# Altium schematic symbol library Diodes - TVS.SchLib: 5379 symbols (part 35 of 35)
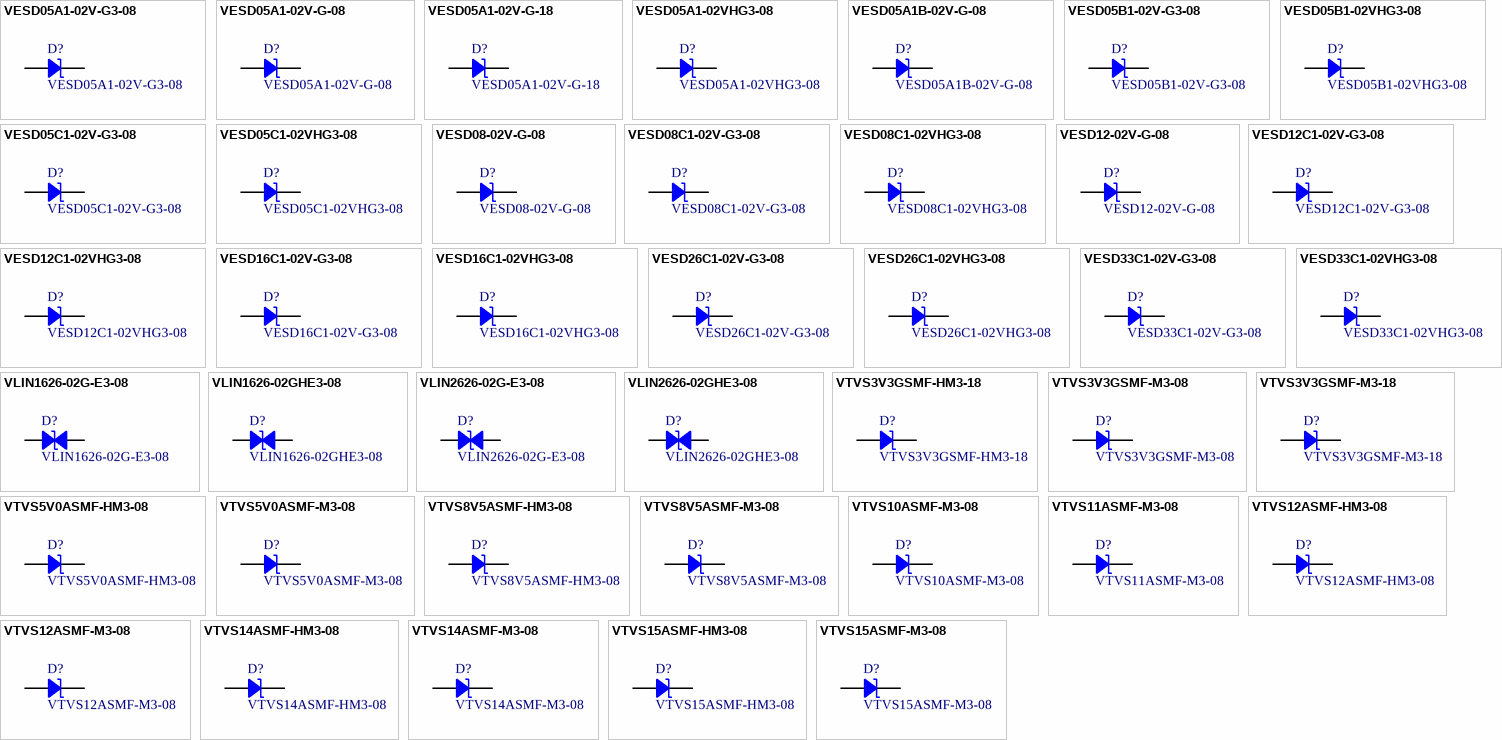
[diagram p168: symbols VESD05A1-02V-G3-08 to VTVS15ASMF-M3-08]

## VTVS3V3GSMF-HM3-18
designator D?
ESD PROTECTION DIODE DO-219AB-HM; Manufacturer: Vishay Semiconductor Diodes Division; Capacitance @ Frequency: 2095pF @ 1MHz; Current - Peak Pulse (10/1000µs): 43.99A; Power Line Protection: No; Power - Peak Pulse: 400W; Type: Zener; Unidirectional Channels: 1; Voltage - Breakdown (Min): 6.57V; Voltage - Clamping (Max) @ Ipp: 8.9V; Voltage - Reverse Standoff (Typ): 3.3V; Part Number: VTVS3V3GSMF-HM3-18; Applications: Automotive; ComponentLink1Description: Datasheet; ComponentLink1URL: http://www.vishay.com/docs/85891/vtvs3v3asmf.pdf; ComponentLink2Description: DigiKey Link; ComponentLink2URL: http://digikey.com/product-detail/en/vishay-semiconductor-diodes-division/VTVS3V3GSMF-HM3-18/VTVS3V3GSMF-HM3-18GICT-ND/9467502; LastUpdated: 9/2/2020 1:27:45 AM; Lifecycle Status: Active; Minimum Order: 1; Mounting Type: Surface Mount; Operating Temperature: 175°C (TJ); Package / Case: DO-219AB; Packaging: TapeAndReel; PartId: 5498; Part Status: Active; Price: 0.19; Series: Automotive, AEC-Q101, TransZorb®; Supplier 1: DigiKey; Supplier Part Number 1: VTVS3V3GSMF-HM3-18GICT-ND; Supplier Device Package: DO-219AB (SMF)
footprint SMF DO-219AB
pins: 1, 2

## VTVS3V3GSMF-M3-08
designator D?
ESD PROTECTION DIODE DO-219AB-M3; Manufacturer: Vishay Semiconductor Diodes Division; Capacitance @ Frequency: 2095pF @ 1MHz; Current - Peak Pulse (10/1000µs): 43.99A; Power Line Protection: No; Power - Peak Pulse: 400W; Type: Zener; Unidirectional Channels: 1; Voltage - Breakdown (Min): 6.57V; Voltage - Clamping (Max) @ Ipp: 8.9V; Voltage - Reverse Standoff (Typ): 3.3V; Part Number: VTVS3V3GSMF-M3-08; Applications: General Purpose; ComponentLink1Description: Datasheet; ComponentLink1URL: http://www.vishay.com/docs/85891/vtvs3v3asmf.pdf; ComponentLink2Description: DigiKey Link; ComponentLink2URL: http://digikey.com/product-detail/en/vishay-semiconductor-diodes-division/VTVS3V3GSMF-M3-08/VTVS3V3GSMF-M3-08GICT-ND/9467503; LastUpdated: 9/2/2020 1:27:45 AM; Lifecycle Status: Active; Minimum Order: 1; Mounting Type: Surface Mount; Operating Temperature: 175°C (TJ); Package / Case: DO-219AB; Packaging: TapeAndReel; PartId: 5497; Part Status: Active; Price: 0.21; Series: TransZorb®; Supplier 1: DigiKey; Supplier Part Number 1: VTVS3V3GSMF-M3-08GICT-ND; Supplier Device Package: DO-219AB (SMF)
footprint SMF DO-219AB
pins: 1, 2

## VTVS3V3GSMF-M3-18
designator D?
ESD PROTECTION DIODE DO-219AB-M3; Manufacturer: Vishay Semiconductor Diodes Division; Capacitance @ Frequency: 2095pF @ 1MHz; Current - Peak Pulse (10/1000µs): 43.99A; Power Line Protection: No; Power - Peak Pulse: 400W; Type: Zener; Unidirectional Channels: 1; Voltage - Breakdown (Min): 6.57V; Voltage - Clamping (Max) @ Ipp: 8.9V; Voltage - Reverse Standoff (Typ): 3.3V; Part Number: VTVS3V3GSMF-M3-18; Applications: General Purpose; ComponentLink1Description: Datasheet; ComponentLink1URL: http://www.vishay.com/docs/85891/vtvs3v3asmf.pdf; ComponentLink2Description: DigiKey Link; ComponentLink2URL: http://digikey.com/product-detail/en/vishay-semiconductor-diodes-division/VTVS3V3GSMF-M3-18/VTVS3V3GSMF-M3-18GICT-ND/9467504; LastUpdated: 9/2/2020 1:27:45 AM; Lifecycle Status: Active; Minimum Order: 1; Mounting Type: Surface Mount; Operating Temperature: 175°C (TJ); Package / Case: DO-219AB; Packaging: TapeAndReel; PartId: 5499; Part Status: Active; Price: 0.17; Series: TransZorb®; Supplier 1: DigiKey; Supplier Part Number 1: VTVS3V3GSMF-M3-18GICT-ND; Supplier Device Package: DO-219AB (SMF)
footprint SMF DO-219AB
pins: 1, 2

## VTVS5V0ASMF-HM3-08
designator D?
TVS DIODE 5V 8.9V DO219AB; Manufacturer: Vishay Semiconductor Diodes Division; Capacitance @ Frequency: 2095pF @ 1MHz; Current - Peak Pulse (10/1000µs): 42.95A; Power Line Protection: No; Power - Peak Pulse: 400W; Type: Zener; Unidirectional Channels: 1; Voltage - Breakdown (Min): 6.4V; Part Number: VTVS5V0ASMF-HM3-08; Applications: Automotive; ComponentLink1Description: Datasheet; ComponentLink1URL: http://www.vishay.com/docs/85891/vtvs3v3asmf.pdf; ComponentLink2Description: DigiKey Link; ComponentLink2URL: http://digikey.com/product-detail/en/vishay-semiconductor-diodes-division/VTVS5V0ASMF-HM3-08/VTVS5V0ASMF-HM3-08GICT-ND/7056002; LastUpdated: 9/2/2020 1:27:46 AM; Lifecycle Status: Active; Minimum Order: 1; Mounting Type: Surface Mount; Operating Temperature: -55°C ~ 175°C (TJ); Package / Case: DO-219AB; Packaging: TapeAndReel; PartId: 5532; Part Status: Active; Price: 0.12; Series: Automotive, AEC-Q101, TransZorb®; Supplier 1: DigiKey; Supplier Part Number 1: VTVS5V0ASMF-HM3-08GICT-ND; Supplier Device Package: DO-219AB (SMF); Voltage - Clamping (Max) @ Ipp: 8.9V; Voltage - Reverse Standoff (Typ): 5V
footprint SMF DO-219AB
pins: 1, 2

## VTVS5V0ASMF-M3-08
designator D?
TVS DIODE 5V 8.9V DO219AB; Manufacturer: Vishay Semiconductor Diodes Division; Capacitance @ Frequency: 2095pF @ 1MHz; Current - Peak Pulse (10/1000µs): 42.95A; Power Line Protection: No; Power - Peak Pulse: 400W; Type: Zener; Unidirectional Channels: 1; Voltage - Breakdown (Min): 6.4V; Part Number: VTVS5V0ASMF-M3-08; Applications: General Purpose; ComponentLink1Description: Datasheet; ComponentLink1URL: http://www.vishay.com/docs/85891/vtvs3v3asmf.pdf; ComponentLink2Description: DigiKey Link; ComponentLink2URL: http://digikey.com/product-detail/en/vishay-semiconductor-diodes-division/VTVS5V0ASMF-M3-08/VTVS5V0ASMF-M3-08GICT-ND/7056003; LastUpdated: 9/2/2020 1:27:45 AM; Lifecycle Status: Active; Minimum Order: 1; Mounting Type: Surface Mount; Operating Temperature: -55°C ~ 175°C (TJ); Package / Case: DO-219AB; Packaging: TapeAndReel; PartId: 5492; Part Status: Active; Price: 0.11; Series: TransZorb®; Supplier 1: DigiKey; Supplier Part Number 1: VTVS5V0ASMF-M3-08GICT-ND; Supplier Device Package: DO-219AB (SMF); Voltage - Clamping (Max) @ Ipp: 8.9V; Voltage - Reverse Standoff (Typ): 5V
footprint SMF DO-219AB
pins: 1, 2

## VTVS8V5ASMF-HM3-08
designator D?
TVS DIODE 8.5V 13.5V DO219AB; Manufacturer: Vishay Semiconductor Diodes Division; Capacitance @ Frequency: 1270pF @ 1MHz; Current - Peak Pulse (10/1000µs): 28.24A; Power Line Protection: No; Power - Peak Pulse: 400W; Type: Zener; Unidirectional Channels: 1; Voltage - Breakdown (Min): 9.5V; Part Number: VTVS8V5ASMF-HM3-08; Applications: Automotive; ComponentLink1Description: Datasheet; ComponentLink1URL: http://www.vishay.com/docs/85891/vtvs3v3asmf.pdf; ComponentLink2Description: DigiKey Link; ComponentLink2URL: http://digikey.com/product-detail/en/vishay-semiconductor-diodes-division/VTVS8V5ASMF-HM3-08/VTVS8V5ASMF-HM3-08GICT-ND/7402749; LastUpdated: 9/2/2020 1:27:45 AM; Lifecycle Status: Active; Minimum Order: 1; Mounting Type: Surface Mount; Operating Temperature: -55°C ~ 175°C (TJ); Package / Case: DO-219AB; Packaging: TapeAndReel; PartId: 5527; Part Status: Active; Price: 0.12; Series: Automotive, AEC-Q101, TransZorb®; Supplier 1: DigiKey; Supplier Part Number 1: VTVS8V5ASMF-HM3-08GICT-ND; Supplier Device Package: DO-219AB (SMF); Voltage - Clamping (Max) @ Ipp: 13.5V; Voltage - Reverse Standoff (Typ): 8.5V
footprint SMF DO-219AB
pins: 1, 2

## VTVS8V5ASMF-M3-08
designator D?
TVS DIODE 8.5V 13.5V DO219AB; Manufacturer: Vishay Semiconductor Diodes Division; Capacitance @ Frequency: 1270pF @ 1MHz; Current - Peak Pulse (10/1000µs): 28.24A; Power Line Protection: No; Power - Peak Pulse: 400W; Type: Zener; Unidirectional Channels: 1; Voltage - Breakdown (Min): 9.5V; Part Number: VTVS8V5ASMF-M3-08; Applications: General Purpose; ComponentLink1Description: Datasheet; ComponentLink1URL: http://www.vishay.com/docs/85891/vtvs3v3asmf.pdf; ComponentLink2Description: DigiKey Link; ComponentLink2URL: http://digikey.com/product-detail/en/vishay-semiconductor-diodes-division/VTVS8V5ASMF-M3-08/VTVS8V5ASMF-M3-08GICT-ND/7402750; LastUpdated: 9/2/2020 1:27:45 AM; Lifecycle Status: Active; Minimum Order: 1; Mounting Type: Surface Mount; Operating Temperature: -55°C ~ 175°C (TJ); Package / Case: DO-219AB; Packaging: TapeAndReel; PartId: 5489; Part Status: Active; Price: 0.11; Series: TransZorb®; Supplier 1: DigiKey; Supplier Part Number 1: VTVS8V5ASMF-M3-08GICT-ND; Supplier Device Package: DO-219AB (SMF); Voltage - Clamping (Max) @ Ipp: 13.5V; Voltage - Reverse Standoff (Typ): 8.5V
footprint SMF DO-219AB
pins: 1, 2

## VTVS10ASMF-M3-08
designator D?
TVS DIODE 10.3V 16.3V DO219AB; Manufacturer: Vishay Semiconductor Diodes Division; Capacitance @ Frequency: 988pF @ 1MHz; Current - Peak Pulse (10/1000µs): 23.2A; Power Line Protection: No; Power - Peak Pulse: 400W; Type: Zener; Unidirectional Channels: 1; Voltage - Breakdown (Min): 11.4V; Part Number: VTVS10ASMF-M3-08; Applications: General Purpose; ComponentLink1Description: Datasheet; ComponentLink1URL: http://www.vishay.com/docs/85891/vtvs3v3asmf.pdf; ComponentLink2Description: DigiKey Link; ComponentLink2URL: http://digikey.com/product-detail/en/vishay-semiconductor-diodes-division/VTVS10ASMF-M3-08/VTVS10ASMF-M3-08GICT-ND/7055978; LastUpdated: 9/2/2020 1:27:45 AM; Lifecycle Status: Active; Minimum Order: 1; Mounting Type: Surface Mount; Operating Temperature: -55°C ~ 175°C (TJ); Package / Case: DO-219AB; Packaging: TapeAndReel; PartId: 5528; Part Status: Active; Price: 0.11; Series: TransZorb®; Supplier 1: DigiKey; Supplier Part Number 1: VTVS10ASMF-M3-08GICT-ND; Supplier Device Package: DO-219AB (SMF); Voltage - Clamping (Max) @ Ipp: 16.3V; Voltage - Reverse Standoff (Typ): 10.3V
footprint SMF DO-219AB
pins: 1, 2

## VTVS11ASMF-M3-08
designator D?
TVS DIODE 11.2V 18V DO219AB; Manufacturer: Vishay Semiconductor Diodes Division; Capacitance @ Frequency: 910pF @ 1MHz; Current - Peak Pulse (10/1000µs): 21.13A; Power Line Protection: No; Power - Peak Pulse: 400W; Type: DO-219AB; Unidirectional Channels: 1; Voltage - Breakdown (Min): 12.6V; Part Number: VTVS11ASMF-M3-08; Applications: General Purpose; ComponentLink1Description: Datasheet; ComponentLink1URL: http://www.vishay.com/docs/85891/vtvs3v3asmf.pdf; ComponentLink2Description: DigiKey Link; ComponentLink2URL: http://digikey.com/product-detail/en/vishay-semiconductor-diodes-division/VTVS11ASMF-M3-08/112-VTVS11ASMF-M3-08CT-ND/11562550; LastUpdated: 9/2/2020 1:27:45 AM; Lifecycle Status: Active; Minimum Order: 0; Mounting Type: Surface Mount; Operating Temperature: -55°C ~ 175°C (TJ); Package / Case: DO-219AB; Packaging: TapeAndReel; PartId: 5482; Part Status: -55°C ~ 175°C (TJ); Price: 0.09; Series: TransZorb®; Supplier 1: DigiKey; Supplier Part Number 1: 112-VTVS11ASMF-M3-08CT-ND; Supplier Device Package: DO-219AB (SMF); Voltage - Clamping (Max) @ Ipp: 18V; Voltage - Reverse Standoff (Typ): 11.2V
footprint SMF DO-219AB
pins: 1, 2

## VTVS12ASMF-HM3-08
designator D?
TVS DIODE 12.4V 20.1V DO219AB; Manufacturer: Vishay Semiconductor Diodes Division; Capacitance @ Frequency: 807pF @ 1MHz; Current - Peak Pulse (10/1000µs): 19.01A; Power Line Protection: No; Power - Peak Pulse: 400W; Type: Zener; Unidirectional Channels: 1; Voltage - Breakdown (Min): 14V; Part Number: VTVS12ASMF-HM3-08; Applications: Automotive; ComponentLink1Description: Datasheet; ComponentLink1URL: http://www.vishay.com/docs/85891/vtvs3v3asmf.pdf; ComponentLink2Description: DigiKey Link; ComponentLink2URL: http://digikey.com/product-detail/en/vishay-semiconductor-diodes-division/VTVS12ASMF-HM3-08/VTVS12ASMF-HM3-08GICT-ND/7055980; LastUpdated: 9/2/2020 1:27:45 AM; Lifecycle Status: Active; Minimum Order: 1; Mounting Type: Surface Mount; Operating Temperature: -55°C ~ 175°C (TJ); Package / Case: DO-219AB; Packaging: TapeAndReel; PartId: 5495; Part Status: Active; Price: 0.12; Series: Automotive, AEC-Q101, TransZorb®; Supplier 1: DigiKey; Supplier Part Number 1: VTVS12ASMF-HM3-08GICT-ND; Supplier Device Package: DO-219AB (SMF); Voltage - Clamping (Max) @ Ipp: 20.1V; Voltage - Reverse Standoff (Typ): 12.4V
footprint SMF DO-219AB
pins: 1, 2

## VTVS12ASMF-M3-08
designator D?
TVS DIODE 12.4V 20.1V DO219AB; Manufacturer: Vishay Semiconductor Diodes Division; Capacitance @ Frequency: 807pF @ 1MHz; Current - Peak Pulse (10/1000µs): 19.01A; Power Line Protection: No; Power - Peak Pulse: 400W; Type: Zener; Unidirectional Channels: 1; Voltage - Breakdown (Min): 14V; Part Number: VTVS12ASMF-M3-08; Applications: General Purpose; ComponentLink1Description: Datasheet; ComponentLink1URL: http://www.vishay.com/docs/85891/vtvs3v3asmf.pdf; ComponentLink2Description: DigiKey Link; ComponentLink2URL: http://digikey.com/product-detail/en/vishay-semiconductor-diodes-division/VTVS12ASMF-M3-08/VTVS12ASMF-M3-08GICT-ND/7055981; LastUpdated: 9/2/2020 1:27:45 AM; Lifecycle Status: Active; Minimum Order: 1; Mounting Type: Surface Mount; Operating Temperature: -55°C ~ 175°C (TJ); Package / Case: DO-219AB; Packaging: TapeAndReel; PartId: 5490; Part Status: Active; Price: 0.11; Series: TransZorb®; Supplier 1: DigiKey; Supplier Part Number 1: VTVS12ASMF-M3-08GICT-ND; Supplier Device Package: DO-219AB (SMF); Voltage - Clamping (Max) @ Ipp: 20.1V; Voltage - Reverse Standoff (Typ): 12.4V
footprint SMF DO-219AB
pins: 1, 2

## VTVS14ASMF-HM3-08
designator D?
TVS DIODE 13.8V 22.2V DO219AB; Manufacturer: Vishay Semiconductor Diodes Division; Capacitance @ Frequency: 752pF @ 1MHz; Current - Peak Pulse (10/1000µs): 17.16A; Power Line Protection: No; Power - Peak Pulse: 400W; Type: DO-219AB; Unidirectional Channels: 1; Voltage - Breakdown (Min): 15.4V; Part Number: VTVS14ASMF-HM3-08; Applications: Automotive; ComponentLink1Description: Datasheet; ComponentLink1URL: http://www.vishay.com/docs/85891/vtvs3v3asmf.pdf; ComponentLink2Description: DigiKey Link; ComponentLink2URL: http://digikey.com/product-detail/en/vishay-semiconductor-diodes-division/VTVS14ASMF-HM3-08/112-VTVS14ASMF-HM3-08DKR-ND/11562579; LastUpdated: 9/2/2020 1:27:45 AM; Lifecycle Status: Active; Minimum Order: 0; Mounting Type: Surface Mount; Operating Temperature: -55°C ~ 175°C (TJ); Package / Case: DO-219AB; Packaging: TapeAndReel; PartId: 5480; Part Status: -55°C ~ 175°C (TJ); Price: 0.10; Series: Automotive, AEC-Q101, TransZorb®; Supplier 1: DigiKey; Supplier Part Number 1: 112-VTVS14ASMF-HM3-08DKR-ND; Supplier Device Package: DO-219AB (SMF); Voltage - Clamping (Max) @ Ipp: 22.2V; Voltage - Reverse Standoff (Typ): 13.8V
footprint SMF DO-219AB
pins: 1, 2

## VTVS14ASMF-M3-08
designator D?
TVS DIODE 13.8V 22.2V DO219AB; Manufacturer: Vishay Semiconductor Diodes Division; Capacitance @ Frequency: 752pF @ 1MHz; Current - Peak Pulse (10/1000µs): 17.16A; Power Line Protection: No; Power - Peak Pulse: 400W; Type: DO-219AB; Unidirectional Channels: 1; Voltage - Breakdown (Min): 15.4V; Part Number: VTVS14ASMF-M3-08; Applications: General Purpose; ComponentLink1Description: Datasheet; ComponentLink1URL: http://www.vishay.com/docs/85891/vtvs3v3asmf.pdf; ComponentLink2Description: DigiKey Link; ComponentLink2URL: http://digikey.com/product-detail/en/vishay-semiconductor-diodes-division/VTVS14ASMF-M3-08/112-VTVS14ASMF-M3-08DKR-ND/11562553; LastUpdated: 9/2/2020 1:27:45 AM; Lifecycle Status: Active; Minimum Order: 0; Mounting Type: Surface Mount; Operating Temperature: -55°C ~ 175°C (TJ); Package / Case: DO-219AB; Packaging: TapeAndReel; PartId: 5485; Part Status: -55°C ~ 175°C (TJ); Price: 0.09; Series: TransZorb®; Supplier 1: DigiKey; Supplier Part Number 1: 112-VTVS14ASMF-M3-08DKR-ND; Supplier Device Package: DO-219AB (SMF); Voltage - Clamping (Max) @ Ipp: 22.2V; Voltage - Reverse Standoff (Typ): 13.8V
footprint SMF DO-219AB
pins: 1, 2

## VTVS15ASMF-HM3-08
designator D?
TVS DIODE 15.1V 25V DO219AB; Manufacturer: Vishay Semiconductor Diodes Division; Capacitance @ Frequency: 684pF @ 1MHz; Current - Peak Pulse (10/1000µs): 15.47A; Power Line Protection: No; Power - Peak Pulse: 400W; Type: Zener; Unidirectional Channels: 1; Voltage - Breakdown (Min): 17.1V; Part Number: VTVS15ASMF-HM3-08; Applications: Automotive; ComponentLink1Description: Datasheet; ComponentLink1URL: http://www.vishay.com/docs/85891/vtvs3v3asmf.pdf; ComponentLink2Description: DigiKey Link; ComponentLink2URL: http://digikey.com/product-detail/en/vishay-semiconductor-diodes-division/VTVS15ASMF-HM3-08/VTVS15ASMF-HM3-08GICT-ND/9601411; LastUpdated: 9/2/2020 1:27:46 AM; Lifecycle Status: Active; Minimum Order: 1; Mounting Type: Surface Mount; Operating Temperature: -55°C ~ 175°C (TJ); Package / Case: DO-219AB; Packaging: TapeAndReel; PartId: 5535; Part Status: Active; Price: 0.12; Series: Automotive, AEC-Q101, TransZorb®; Supplier 1: DigiKey; Supplier Part Number 1: VTVS15ASMF-HM3-08GICT-ND; Supplier Device Package: DO-219AB (SMF); Voltage - Clamping (Max) @ Ipp: 25V; Voltage - Reverse Standoff (Typ): 15.1V
footprint SMF DO-219AB
pins: 1, 2

## VTVS15ASMF-M3-08
designator D?
TVS DIODE 15.1V 25V DO219AB; Manufacturer: Vishay Semiconductor Diodes Division; Capacitance @ Frequency: 684pF @ 1MHz; Current - Peak Pulse (10/1000µs): 15.47A; Power Line Protection: No; Power - Peak Pulse: 400W; Type: Zener; Unidirectional Channels: 1; Voltage - Breakdown (Min): 17.1V; Part Number: VTVS15ASMF-M3-08; Applications: General Purpose; ComponentLink1Description: Datasheet; ComponentLink1URL: http://www.vishay.com/docs/85891/vtvs3v3asmf.pdf; ComponentLink2Description: DigiKey Link; ComponentLink2URL: http://digikey.com/product-detail/en/vishay-semiconductor-diodes-division/VTVS15ASMF-M3-08/VTVS15ASMF-M3-08GICT-ND/7055985; LastUpdated: 9/2/2020 1:27:45 AM; Lifecycle Status: Active; Minimum Order: 1; Mounting Type: Surface Mount; Operating Temperature: -55°C ~ 175°C (TJ); Package / Case: DO-219AB; Packaging: TapeAndReel; PartId: 5493; Part Status: Active; Price: 0.11; Series: TransZorb®; Supplier 1: DigiKey; Supplier Part Number 1: VTVS15ASMF-M3-08GICT-ND; Supplier Device Package: DO-219AB (SMF); Voltage - Clamping (Max) @ Ipp: 25V; Voltage - Reverse Standoff (Typ): 15.1V
footprint SMF DO-219AB
pins: 1, 2

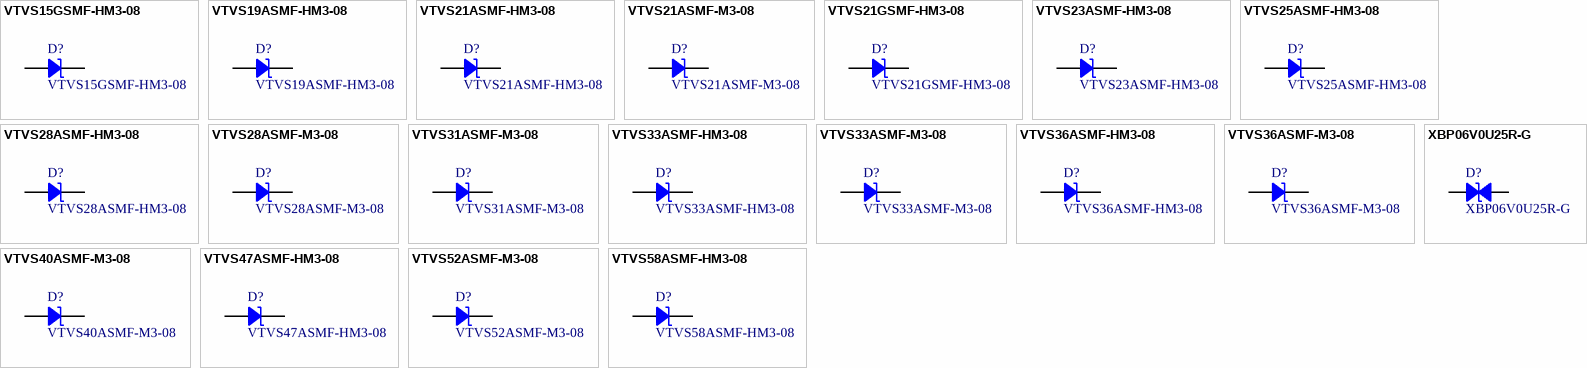
[diagram p134: symbols VTVS15GSMF-HM3-08 to XBP06V0U25R-G]

## VTVS15GSMF-HM3-08
designator D?
TVS DIODE 15.1V 25V DO219AB; Manufacturer: Vishay Semiconductor Diodes Division; Capacitance @ Frequency: 684pF @ 1MHz; Current - Peak Pulse (10/1000µs): 15.89A; Power Line Protection: No; Power - Peak Pulse: 400W; Type: Zener; Unidirectional Channels: 1; Voltage - Breakdown (Min): 17.6V; Part Number: VTVS15GSMF-HM3-08; Applications: Automotive; ComponentLink1Description: Datasheet; ComponentLink1URL: http://www.vishay.com/docs/85891/vtvs3v3asmf.pdf; ComponentLink2Description: DigiKey Link; ComponentLink2URL: http://digikey.com/product-detail/en/vishay-semiconductor-diodes-division/VTVS15GSMF-HM3-08/VTVS15GSMF-HM3-08GICT-ND/7055986; LastUpdated: 9/2/2020 1:27:45 AM; Lifecycle Status: Active; Minimum Order: 1; Mounting Type: Surface Mount; Operating Temperature: -55°C ~ 175°C (TJ); Package / Case: DO-219AB; Packaging: TapeAndReel; PartId: 5487; Part Status: Active; Price: 0.23; Series: Automotive, AEC-Q101, TransZorb®; Supplier 1: DigiKey; Supplier Part Number 1: VTVS15GSMF-HM3-08GICT-ND; Supplier Device Package: DO-219AB (SMF); Voltage - Clamping (Max) @ Ipp: 25V; Voltage - Reverse Standoff (Typ): 15.1V
footprint SMF DO-219AB
pins: 1, 2

## VTVS19ASMF-HM3-08
designator D?
TVS DIODE 18.7V 31V DO219AB; Manufacturer: Vishay Semiconductor Diodes Division; Capacitance @ Frequency: 558pF @ 1MHz; Current - Peak Pulse (10/1000µs): 12.44A; Power Line Protection: No; Power - Peak Pulse: 400W; Type: DO-219AB; Unidirectional Channels: 1; Voltage - Breakdown (Min): 20.9V; Part Number: VTVS19ASMF-HM3-08; Applications: Automotive; ComponentLink1Description: Datasheet; ComponentLink1URL: http://www.vishay.com/docs/85891/vtvs3v3asmf.pdf; ComponentLink2Description: DigiKey Link; ComponentLink2URL: http://digikey.com/product-detail/en/vishay-semiconductor-diodes-division/VTVS19ASMF-HM3-08/112-VTVS19ASMF-HM3-08CT-ND/11562574; LastUpdated: 9/2/2020 1:27:45 AM; Lifecycle Status: Active; Minimum Order: 0; Mounting Type: Surface Mount; Operating Temperature: -55°C ~ 175°C (TJ); Package / Case: DO-219AB; Packaging: TapeAndReel; PartId: 5477; Part Status: -55°C ~ 175°C (TJ); Price: 0.10; Series: Automotive, AEC-Q101, TransZorb®; Supplier 1: DigiKey; Supplier Part Number 1: 112-VTVS19ASMF-HM3-08CT-ND; Supplier Device Package: DO-219AB (SMF); Voltage - Clamping (Max) @ Ipp: 31V; Voltage - Reverse Standoff (Typ): 18.7V
footprint SMF DO-219AB
pins: 1, 2

## VTVS21ASMF-HM3-08
designator D?
TVS DIODE 20.5V 34V DO219AB; Manufacturer: Vishay Semiconductor Diodes Division; Capacitance @ Frequency: 513pF @ 1MHz; Current - Peak Pulse (10/1000µs): 11.33A; Power Line Protection: No; Power - Peak Pulse: 400W; Type: Zener; Unidirectional Channels: 1; Voltage - Breakdown (Min): 23V; Part Number: VTVS21ASMF-HM3-08; Applications: Automotive; ComponentLink1Description: Datasheet; ComponentLink1URL: http://www.vishay.com/docs/85891/vtvs3v3asmf.pdf; ComponentLink2Description: DigiKey Link; ComponentLink2URL: http://digikey.com/product-detail/en/vishay-semiconductor-diodes-division/VTVS21ASMF-HM3-08/VTVS21ASMF-HM3-08GICT-ND/7055987; LastUpdated: 9/2/2020 1:27:45 AM; Lifecycle Status: Active; Minimum Order: 1; Mounting Type: Surface Mount; Operating Temperature: -55°C ~ 175°C (TJ); Package / Case: DO-219AB; Packaging: TapeAndReel; PartId: 5515; Part Status: Active; Price: 0.12; Series: Automotive, AEC-Q101, TransZorb®; Supplier 1: DigiKey; Supplier Part Number 1: VTVS21ASMF-HM3-08GICT-ND; Supplier Device Package: DO-219AB (SMF); Voltage - Clamping (Max) @ Ipp: 34V; Voltage - Reverse Standoff (Typ): 20.5V
footprint SMF DO-219AB
pins: 1, 2

## VTVS21ASMF-M3-08
designator D?
TVS DIODE 20.5V 34V DO219AB; Manufacturer: Vishay Semiconductor Diodes Division; Capacitance @ Frequency: 513pF @ 1MHz; Current - Peak Pulse (10/1000µs): 11.33A; Power Line Protection: No; Power - Peak Pulse: 400W; Type: Zener; Unidirectional Channels: 1; Voltage - Breakdown (Min): 23V; Part Number: VTVS21ASMF-M3-08; Applications: General Purpose; ComponentLink1Description: Datasheet; ComponentLink1URL: http://www.vishay.com/docs/85891/vtvs3v3asmf.pdf; ComponentLink2Description: DigiKey Link; ComponentLink2URL: http://digikey.com/product-detail/en/vishay-semiconductor-diodes-division/VTVS21ASMF-M3-08/VTVS21ASMF-M3-08GICT-ND/7055988; LastUpdated: 9/2/2020 1:27:45 AM; Lifecycle Status: Active; Minimum Order: 1; Mounting Type: Surface Mount; Operating Temperature: -55°C ~ 175°C (TJ); Package / Case: DO-219AB; Packaging: TapeAndReel; PartId: 5494; Part Status: Active; Price: 0.11; Series: TransZorb®; Supplier 1: DigiKey; Supplier Part Number 1: VTVS21ASMF-M3-08GICT-ND; Supplier Device Package: DO-219AB (SMF); Voltage - Clamping (Max) @ Ipp: 34V; Voltage - Reverse Standoff (Typ): 20.5V
footprint SMF DO-219AB
pins: 1, 2

## VTVS21GSMF-HM3-08
designator D?
TVS DIODE 20.5V 34V DO219AB; Manufacturer: Vishay Semiconductor Diodes Division; Capacitance @ Frequency: 513pF @ 1MHz; Current - Peak Pulse (10/1000µs): 11.67A; Power Line Protection: No; Power - Peak Pulse: 400W; Type: Zener; Unidirectional Channels: 1; Voltage - Breakdown (Min): 23.72V; Part Number: VTVS21GSMF-HM3-08; Applications: Automotive; ComponentLink1Description: Datasheet; ComponentLink1URL: http://www.vishay.com/docs/85891/vtvs3v3asmf.pdf; ComponentLink2Description: DigiKey Link; ComponentLink2URL: http://digikey.com/product-detail/en/vishay-semiconductor-diodes-division/VTVS21GSMF-HM3-08/VTVS21GSMF-HM3-08GICT-ND/7055989; LastUpdated: 9/2/2020 1:27:45 AM; Lifecycle Status: Active; Minimum Order: 1; Mounting Type: Surface Mount; Operating Temperature: -55°C ~ 175°C (TJ); Package / Case: DO-219AB; Packaging: TapeAndReel; PartId: 5488; Part Status: Active; Price: 0.23; Series: Automotive, AEC-Q101, TransZorb®; Supplier 1: DigiKey; Supplier Part Number 1: VTVS21GSMF-HM3-08GICT-ND; Supplier Device Package: DO-219AB (SMF); Voltage - Clamping (Max) @ Ipp: 34V; Voltage - Reverse Standoff (Typ): 20.5V
footprint SMF DO-219AB
pins: 1, 2

## VTVS23ASMF-HM3-08
designator D?
TVS DIODE 22.6V 38V DO219AB; Manufacturer: Vishay Semiconductor Diodes Division; Capacitance @ Frequency: 480pF @ 1MHz; Current - Peak Pulse (10/1000µs): 10.09A; Power Line Protection: No; Power - Peak Pulse: 400W; Type: Zener; Unidirectional Channels: 1; Voltage - Breakdown (Min): 25.7V; Part Number: VTVS23ASMF-HM3-08; Applications: Automotive; ComponentLink1Description: Datasheet; ComponentLink1URL: http://www.vishay.com/docs/85891/vtvs3v3asmf.pdf; ComponentLink2Description: DigiKey Link; ComponentLink2URL: http://digikey.com/product-detail/en/vishay-semiconductor-diodes-division/VTVS23ASMF-HM3-08/VTVS23ASMF-HM3-08GICT-ND/9601412; LastUpdated: 9/2/2020 1:27:46 AM; Lifecycle Status: Active; Minimum Order: 1; Mounting Type: Surface Mount; Operating Temperature: -55°C ~ 175°C (TJ); Package / Case: DO-219AB; Packaging: TapeAndReel; PartId: 5534; Part Status: Active; Price: 0.12; Series: Automotive, AEC-Q101, TransZorb®; Supplier 1: DigiKey; Supplier Part Number 1: VTVS23ASMF-HM3-08GICT-ND; Supplier Device Package: DO-219AB (SMF); Voltage - Clamping (Max) @ Ipp: 38V; Voltage - Reverse Standoff (Typ): 22.6V
footprint SMF DO-219AB
pins: 1, 2

## VTVS25ASMF-HM3-08
designator D?
TVS DIODE 25.2V 42V DO219AB; Manufacturer: Vishay Semiconductor Diodes Division; Capacitance @ Frequency: 433pF @ 1MHz; Current - Peak Pulse (10/1000µs): 9.07A; Power Line Protection: No; Power - Peak Pulse: 400W; Type: DO-219AB; Unidirectional Channels: 1; Voltage - Breakdown (Min): 28.5V; Part Number: VTVS25ASMF-HM3-08; Applications: Automotive; ComponentLink1Description: Datasheet; ComponentLink1URL: http://www.vishay.com/docs/85891/vtvs3v3asmf.pdf; ComponentLink2Description: DigiKey Link; ComponentLink2URL: http://digikey.com/product-detail/en/vishay-semiconductor-diodes-division/VTVS25ASMF-HM3-08/112-VTVS25ASMF-HM3-08CT-ND/11562545; LastUpdated: 9/2/2020 1:27:45 AM; Lifecycle Status: Active; Minimum Order: 0; Mounting Type: Surface Mount; Operating Temperature: -55°C ~ 175°C (TJ); Package / Case: DO-219AB; Packaging: TapeAndReel; PartId: 5479; Part Status: -55°C ~ 175°C (TJ); Price: 0.10; Series: Automotive, AEC-Q101, TransZorb®; Supplier 1: DigiKey; Supplier Part Number 1: 112-VTVS25ASMF-HM3-08CT-ND; Supplier Device Package: DO-219AB (SMF); Voltage - Clamping (Max) @ Ipp: 42V; Voltage - Reverse Standoff (Typ): 25.2V
footprint SMF DO-219AB
pins: 1, 2

## VTVS28ASMF-HM3-08
designator D?
TVS DIODE 27.9V 47V DO219AB; Manufacturer: Vishay Semiconductor Diodes Division; Capacitance @ Frequency: 412pF @ 1MHz; Current - Peak Pulse (10/1000µs): 8.21A; Power Line Protection: No; Power - Peak Pulse: 400W; Type: Zener; Unidirectional Channels: 1; Voltage - Breakdown (Min): 31.4V; Part Number: VTVS28ASMF-HM3-08; Applications: Automotive; ComponentLink1Description: Datasheet; ComponentLink1URL: http://www.vishay.com/docs/85891/vtvs3v3asmf.pdf; ComponentLink2Description: DigiKey Link; ComponentLink2URL: http://digikey.com/product-detail/en/vishay-semiconductor-diodes-division/VTVS28ASMF-HM3-08/VTVS28ASMF-HM3-08GICT-ND/7055990; LastUpdated: 9/2/2020 1:27:46 AM; Lifecycle Status: Active; Minimum Order: 1; Mounting Type: Surface Mount; Operating Temperature: -55°C ~ 175°C (TJ); Package / Case: DO-219AB; Packaging: TapeAndReel; PartId: 5533; Part Status: Active; Price: 0.12; Series: Automotive, AEC-Q101, TransZorb®; Supplier 1: DigiKey; Supplier Part Number 1: VTVS28ASMF-HM3-08GICT-ND; Supplier Device Package: DO-219AB (SMF); Voltage - Clamping (Max) @ Ipp: 47V; Voltage - Reverse Standoff (Typ): 27.9V
footprint SMF DO-219AB
pins: 1, 2

## VTVS28ASMF-M3-08
designator D?
TVS DIODE 27.9V 47V DO219AB; Manufacturer: Vishay Semiconductor Diodes Division; Capacitance @ Frequency: 412pF @ 1MHz; Current - Peak Pulse (10/1000µs): 8.21A; Power Line Protection: No; Power - Peak Pulse: 400W; Type: Zener; Unidirectional Channels: 1; Voltage - Breakdown (Min): 31.4V; Part Number: VTVS28ASMF-M3-08; Applications: General Purpose; ComponentLink1Description: Datasheet; ComponentLink1URL: http://www.vishay.com/docs/85891/vtvs3v3asmf.pdf; ComponentLink2Description: DigiKey Link; ComponentLink2URL: http://digikey.com/product-detail/en/vishay-semiconductor-diodes-division/VTVS28ASMF-M3-08/VTVS28ASMF-M3-08GICT-ND/7055991; LastUpdated: 9/2/2020 1:27:45 AM; Lifecycle Status: Active; Minimum Order: 1; Mounting Type: Surface Mount; Operating Temperature: -55°C ~ 175°C (TJ); Package / Case: DO-219AB; Packaging: TapeAndReel; PartId: 5496; Part Status: Active; Price: 0.11; Series: TransZorb®; Supplier 1: DigiKey; Supplier Part Number 1: VTVS28ASMF-M3-08GICT-ND; Supplier Device Package: DO-219AB (SMF); Voltage - Clamping (Max) @ Ipp: 47V; Voltage - Reverse Standoff (Typ): 27.9V
footprint SMF DO-219AB
pins: 1, 2

## VTVS31ASMF-M3-08
designator D?
TVS DIODE 30.6V 51V DO219AB; Manufacturer: Vishay Semiconductor Diodes Division; Capacitance @ Frequency: 380pF @ 1MHz; Current - Peak Pulse (10/1000µs): 7.51A; Power Line Protection: No; Power - Peak Pulse: 400W; Type: DO-219AB; Unidirectional Channels: 1; Voltage - Breakdown (Min): 34.2V; Part Number: VTVS31ASMF-M3-08; Applications: General Purpose; ComponentLink1Description: Datasheet; ComponentLink1URL: http://www.vishay.com/docs/85891/vtvs3v3asmf.pdf; ComponentLink2Description: DigiKey Link; ComponentLink2URL: http://digikey.com/product-detail/en/vishay-semiconductor-diodes-division/VTVS31ASMF-M3-08/112-VTVS31ASMF-M3-08CT-ND/11562538; LastUpdated: 9/2/2020 1:27:45 AM; Lifecycle Status: Active; Minimum Order: 0; Mounting Type: Surface Mount; Operating Temperature: -55°C ~ 175°C (TJ); Package / Case: DO-219AB; Packaging: TapeAndReel; PartId: 5484; Part Status: -55°C ~ 175°C (TJ); Price: 0.09; Series: TransZorb®; Supplier 1: DigiKey; Supplier Part Number 1: 112-VTVS31ASMF-M3-08CT-ND; Supplier Device Package: DO-219AB (SMF); Voltage - Clamping (Max) @ Ipp: 51V; Voltage - Reverse Standoff (Typ): 30.6V
footprint SMF DO-219AB
pins: 1, 2

## VTVS33ASMF-HM3-08
designator D?
TVS DIODE 33.3V 55V DO219AB; Manufacturer: Vishay Semiconductor Diodes Division; Capacitance @ Frequency: 379pF @ 1MHz; Current - Peak Pulse (10/1000µs): 6.91A; Power Line Protection: No; Power - Peak Pulse: 400W; Type: Zener; Unidirectional Channels: 1; Voltage - Breakdown (Min): 37.1V; Part Number: VTVS33ASMF-HM3-08; Applications: Automotive; ComponentLink1Description: Datasheet; ComponentLink1URL: http://www.vishay.com/docs/85891/vtvs3v3asmf.pdf; ComponentLink2Description: DigiKey Link; ComponentLink2URL: http://digikey.com/product-detail/en/vishay-semiconductor-diodes-division/VTVS33ASMF-HM3-08/VTVS33ASMF-HM3-08GICT-ND/7055993; LastUpdated: 9/2/2020 1:27:45 AM; Lifecycle Status: Active; Minimum Order: 1; Mounting Type: Surface Mount; Operating Temperature: -55°C ~ 175°C (TJ); Package / Case: DO-219AB; Packaging: TapeAndReel; PartId: 5526; Part Status: Active; Price: 0.12; Series: Automotive, AEC-Q101, TransZorb®; Supplier 1: DigiKey; Supplier Part Number 1: VTVS33ASMF-HM3-08GICT-ND; Supplier Device Package: DO-219AB (SMF); Voltage - Clamping (Max) @ Ipp: 55V; Voltage - Reverse Standoff (Typ): 33.3V
footprint SMF DO-219AB
pins: 1, 2

## VTVS33ASMF-M3-08
designator D?
TVS DIODE 33.3V 55V DO219AB; Manufacturer: Vishay Semiconductor Diodes Division; Capacitance @ Frequency: 379pF @ 1MHz; Current - Peak Pulse (10/1000µs): 6.91A; Power Line Protection: No; Power - Peak Pulse: 400W; Type: Zener; Unidirectional Channels: 1; Voltage - Breakdown (Min): 37.1V; Part Number: VTVS33ASMF-M3-08; Applications: General Purpose; ComponentLink1Description: Datasheet; ComponentLink1URL: http://www.vishay.com/docs/85891/vtvs3v3asmf.pdf; ComponentLink2Description: DigiKey Link; ComponentLink2URL: http://digikey.com/product-detail/en/vishay-semiconductor-diodes-division/VTVS33ASMF-M3-08/VTVS33ASMF-M3-08GICT-ND/7055994; LastUpdated: 9/2/2020 1:27:45 AM; Lifecycle Status: Active; Minimum Order: 1; Mounting Type: Surface Mount; Operating Temperature: -55°C ~ 175°C (TJ); Package / Case: DO-219AB; Packaging: TapeAndReel; PartId: 5491; Part Status: Active; Price: 0.11; Series: TransZorb®; Supplier 1: DigiKey; Supplier Part Number 1: VTVS33ASMF-M3-08GICT-ND; Supplier Device Package: DO-219AB (SMF); Voltage - Clamping (Max) @ Ipp: 55V; Voltage - Reverse Standoff (Typ): 33.3V
footprint SMF DO-219AB
pins: 1, 2

## VTVS36ASMF-HM3-08
designator D?
TVS DIODE 36V 61V DO219AB; Manufacturer: Vishay Semiconductor Diodes Division; Capacitance @ Frequency: 342pF @ 1MHz; Current - Peak Pulse (10/1000µs): 6.24A; Power Line Protection: No; Power - Peak Pulse: 400W; Type: Zener; Unidirectional Channels: 1; Voltage - Breakdown (Min): 40.9V; Part Number: VTVS36ASMF-HM3-08; Applications: Automotive; ComponentLink1Description: Datasheet; ComponentLink1URL: http://www.vishay.com/docs/85891/vtvs3v3asmf.pdf; ComponentLink2Description: DigiKey Link; ComponentLink2URL: http://digikey.com/product-detail/en/vishay-semiconductor-diodes-division/VTVS36ASMF-HM3-08/VTVS36ASMF-HM3-08GICT-ND/8565411; LastUpdated: 9/2/2020 1:27:46 AM; Lifecycle Status: Active; Minimum Order: 1; Mounting Type: Surface Mount; Operating Temperature: -55°C ~ 175°C (TJ); Package / Case: DO-219AB; Packaging: TapeAndReel; PartId: 5536; Part Status: Active; Price: 0.12; Series: Automotive, AEC-Q101, TransZorb®; Supplier 1: DigiKey; Supplier Part Number 1: VTVS36ASMF-HM3-08GICT-ND; Supplier Device Package: DO-219AB (SMF); Voltage - Clamping (Max) @ Ipp: 61V; Voltage - Reverse Standoff (Typ): 36V
footprint SMF DO-219AB
pins: 1, 2

## VTVS36ASMF-M3-08
designator D?
TVS DIODE 36V 61V DO219AB; Manufacturer: Vishay Semiconductor Diodes Division; Capacitance @ Frequency: 342pF @ 1MHz; Current - Peak Pulse (10/1000µs): 6.24A; Power Line Protection: No; Power - Peak Pulse: 400W; Type: Zener; Unidirectional Channels: 1; Voltage - Breakdown (Min): 40.9V; Part Number: VTVS36ASMF-M3-08; Applications: General Purpose; ComponentLink1Description: Datasheet; ComponentLink1URL: http://www.vishay.com/docs/85891/vtvs3v3asmf.pdf; ComponentLink2Description: DigiKey Link; ComponentLink2URL: http://digikey.com/product-detail/en/vishay-semiconductor-diodes-division/VTVS36ASMF-M3-08/VTVS36ASMF-M3-08GICT-ND/8565412; LastUpdated: 9/2/2020 1:27:46 AM; Lifecycle Status: Active; Minimum Order: 1; Mounting Type: Surface Mount; Operating Temperature: -55°C ~ 175°C (TJ); Package / Case: DO-219AB; Packaging: TapeAndReel; PartId: 5531; Part Status: Active; Price: 0.11; Series: TransZorb®; Supplier 1: DigiKey; Supplier Part Number 1: VTVS36ASMF-M3-08GICT-ND; Supplier Device Package: DO-219AB (SMF); Voltage - Clamping (Max) @ Ipp: 61V; Voltage - Reverse Standoff (Typ): 36V
footprint SMF DO-219AB
pins: 1, 2

## VTVS40ASMF-M3-08
designator D?
TVS DIODE 39.6V 67V DO219AB; Manufacturer: Vishay Semiconductor Diodes Division; Capacitance @ Frequency: 309pF @ 1MHz; Current - Peak Pulse (10/1000µs): 5.7A; Power Line Protection: No; Power - Peak Pulse: 400W; Type: DO-219AB; Unidirectional Channels: 1; Voltage - Breakdown (Min): 44.7V; Part Number: VTVS40ASMF-M3-08; Applications: General Purpose; ComponentLink1Description: Datasheet; ComponentLink1URL: http://www.vishay.com/docs/85891/vtvs3v3asmf.pdf; ComponentLink2Description: DigiKey Link; ComponentLink2URL: http://digikey.com/product-detail/en/vishay-semiconductor-diodes-division/VTVS40ASMF-M3-08/112-VTVS40ASMF-M3-08CT-ND/11562590; LastUpdated: 9/2/2020 1:27:45 AM; Lifecycle Status: Active; Minimum Order: 0; Mounting Type: Surface Mount; Operating Temperature: -55°C ~ 175°C (TJ); Package / Case: DO-219AB; Packaging: TapeAndReel; PartId: 5481; Part Status: -55°C ~ 175°C (TJ); Price: 0.09; Series: TransZorb®; Supplier 1: DigiKey; Supplier Part Number 1: 112-VTVS40ASMF-M3-08CT-ND; Supplier Device Package: DO-219AB (SMF); Voltage - Clamping (Max) @ Ipp: 67V; Voltage - Reverse Standoff (Typ): 39.6V
footprint SMF DO-219AB
pins: 1, 2

## VTVS47ASMF-HM3-08
designator D?
TVS DIODE 46.8V 80V DO219AB; Manufacturer: Vishay Semiconductor Diodes Division; Capacitance @ Frequency: 293pF @ 1MHz; Current - Peak Pulse (10/1000µs): 4.76A; Power Line Protection: No; Power - Peak Pulse: 400W; Type: DO-219AB; Unidirectional Channels: 1; Voltage - Breakdown (Min): 53.2V; Part Number: VTVS47ASMF-HM3-08; Applications: Automotive; ComponentLink1Description: Datasheet; ComponentLink1URL: http://www.vishay.com/docs/85891/vtvs3v3asmf.pdf; ComponentLink2Description: DigiKey Link; ComponentLink2URL: http://digikey.com/product-detail/en/vishay-semiconductor-diodes-division/VTVS47ASMF-HM3-08/112-VTVS47ASMF-HM3-08CT-ND/11562573; LastUpdated: 9/2/2020 1:27:45 AM; Lifecycle Status: Active; Minimum Order: 0; Mounting Type: Surface Mount; Operating Temperature: -55°C ~ 175°C (TJ); Package / Case: DO-219AB; Packaging: TapeAndReel; PartId: 5478; Part Status: -55°C ~ 175°C (TJ); Price: 0.10; Series: Automotive, AEC-Q101, TransZorb®; Supplier 1: DigiKey; Supplier Part Number 1: 112-VTVS47ASMF-HM3-08CT-ND; Supplier Device Package: DO-219AB (SMF); Voltage - Clamping (Max) @ Ipp: 80V; Voltage - Reverse Standoff (Typ): 46.8V
footprint SMF DO-219AB
pins: 1, 2

## VTVS52ASMF-M3-08
designator D?
TVS DIODE 52.2V 89V DO219AB; Manufacturer: Vishay Semiconductor Diodes Division; Capacitance @ Frequency: 242pF @ 1MHz; Current - Peak Pulse (10/1000µs): 4.28A; Power Line Protection: No; Power - Peak Pulse: 400W; Type: DO-219AB; Unidirectional Channels: 1; Voltage - Breakdown (Min): 58.9V; Part Number: VTVS52ASMF-M3-08; Applications: General Purpose; ComponentLink1Description: Datasheet; ComponentLink1URL: http://www.vishay.com/docs/85891/vtvs3v3asmf.pdf; ComponentLink2Description: DigiKey Link; ComponentLink2URL: http://digikey.com/product-detail/en/vishay-semiconductor-diodes-division/VTVS52ASMF-M3-08/112-VTVS52ASMF-M3-08CT-ND/11562544; LastUpdated: 9/2/2020 1:27:45 AM; Lifecycle Status: Active; Minimum Order: 0; Mounting Type: Surface Mount; Operating Temperature: -55°C ~ 175°C (TJ); Package / Case: DO-219AB; Packaging: TapeAndReel; PartId: 5483; Part Status: -55°C ~ 175°C (TJ); Price: 0.09; Series: TransZorb®; Supplier 1: DigiKey; Supplier Part Number 1: 112-VTVS52ASMF-M3-08CT-ND; Supplier Device Package: DO-219AB (SMF); Voltage - Clamping (Max) @ Ipp: 89V; Voltage - Reverse Standoff (Typ): 52.2V
footprint SMF DO-219AB
pins: 1, 2

## VTVS58ASMF-HM3-08
designator D?
TVS DIODE 57.6V 98V DO219AB; Manufacturer: Vishay Semiconductor Diodes Division; Capacitance @ Frequency: 245pF @ 1MHz; Current - Peak Pulse (10/1000µs): 3.89A; Power Line Protection: No; Power - Peak Pulse: 400W; Type: DO-219AB; Unidirectional Channels: 1; Voltage - Breakdown (Min): 64.6V; Part Number: VTVS58ASMF-HM3-08; Applications: Automotive; ComponentLink1Description: Datasheet; ComponentLink1URL: http://www.vishay.com/docs/85891/vtvs3v3asmf.pdf; ComponentLink2Description: DigiKey Link; ComponentLink2URL: http://digikey.com/product-detail/en/vishay-semiconductor-diodes-division/VTVS58ASMF-HM3-08/112-VTVS58ASMF-HM3-08CT-ND/11562600; LastUpdated: 9/2/2020 1:27:45 AM; Lifecycle Status: Active; Minimum Order: 0; Mounting Type: Surface Mount; Operating Temperature: -55°C ~ 175°C (TJ); Package / Case: DO-219AB; Packaging: TapeAndReel; PartId: 5476; Part Status: -55°C ~ 175°C (TJ); Price: 0.10; Series: Automotive, AEC-Q101, TransZorb®; Supplier 1: DigiKey; Supplier Part Number 1: 112-VTVS58ASMF-HM3-08CT-ND; Supplier Device Package: DO-219AB (SMF); Voltage - Clamping (Max) @ Ipp: 98V; Voltage - Reverse Standoff (Typ): 57.6V
footprint SMF DO-219AB
pins: 1, 2

## XBP06V0U25R-G
designator D?
LOW CAPACITANCE TVS DIODE; Manufacturer: Torex Semiconductor Ltd; Bidirectional Channels: 1; Capacitance @ Frequency: 0.25pF @ 1MHz; Current - Peak Pulse (10/1000µs): 2A (8/20µs); Power Line Protection: No; Type: Zener; Voltage - Breakdown (Min): 6V; Voltage - Clamping (Max) @ Ipp: 14V; Voltage - Reverse Standoff (Typ): 5V (Max); Part Number: XBP06V0U25R-G; Applications: DVI, HDMI, USB; ComponentLink1Description: Datasheet; ComponentLink1URL: https://www.torexsemi.com/file/xbp06v0u25r/XBP06V0U25R.pdf; ComponentLink2Description: DigiKey Link; ComponentLink2URL: http://digikey.com/product-detail/en/torex-semiconductor-ltd/XBP06V0U25R-G/893-1446-1-ND/9770797; Device Package: 0402 (1006 Metric); LastUpdated: 9/2/2020 1:28:48 AM; Lifecycle Status: Active; Minimum Order: 1; Mounting Type: Surface Mount; Operating Temperature: -55°C ~ 125°C (TJ); Package / Case: 0402 (1006 Metric); Packaging: TapeAndReel; PartId: 10432; Part Status: Active; Price: 0.07; Series: -; Supplier 1: DigiKey; Supplier Part Number 1: 893-1446-1-ND; Supplier Device Package: FBP1006-2A
footprint 0402
pins: 1, 2